# Altium footprint library std-th.PcbLib: 171 footprints (part 11 of 11)
Each footprint in its own frame and in the unit in brackets; x right, y up, seen from the top. Pads: shape width x height; smd on the part's side, far side on the other; paste and mask are expansions set on the pad; w line width, h text height; cw(c..) or ccw(c..) is an arc to the next point about the centre after c.
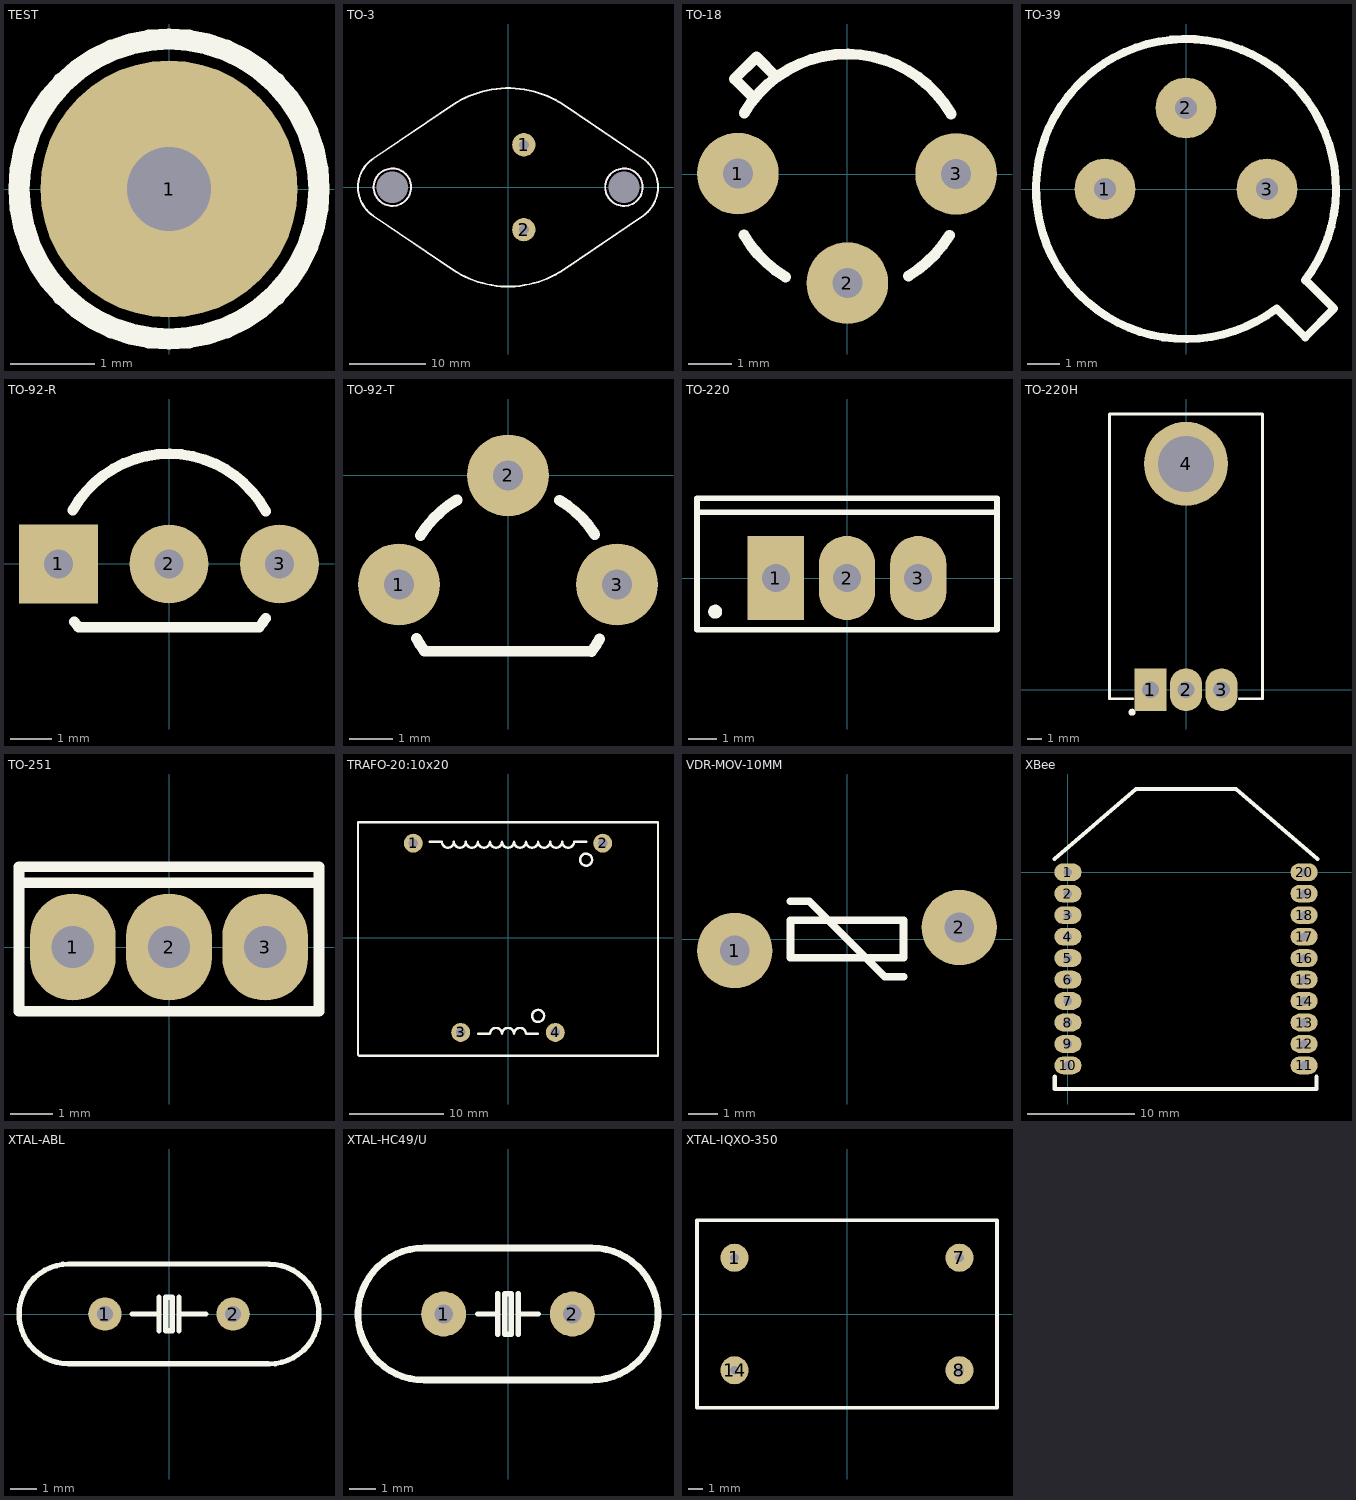
[diagram p10: the footprints below, top view; thin cyan lines are the x and y axes]

## TEST [mil] "Test Point"
pads (1):
  round 120 hole 39.37: 1(0,0)
Top Overlay:
  circle w10: c0,0 r70

## TO-3 [mm] "TO-3 package"
pads (4):
  round 0 hole 4.1: 0(-15.15,0) 1(15.15,0)
  round 3.048 hole 1.3: 1(2.05,5.55) 2(2.05,-5.55)
Top Overlay:
  circle w0.254: c15.15,0 r2.45
  circle w0.254: c-15.15,0 r2.45
  lines w0.254: -17.675,-3.725 cw(c-15.15,0) -17.675,3.725 -7.294,10.761 cw(c0,-0.257) 7.294,10.761 17.675,3.725 cw(c15.049,0) 17.675,-3.725 7.294,-10.761 cw(c0,0) -7.294,-10.761 -17.675,-3.725
Keep-Out Layer:
  circle w0.254: c15.15,0 r2.45
  circle w0.254: c-15.15,0 r2.45
3D body "User Library-2N3055_New.step": height 9.26, standoff -2.64, extent -19.65,-13 19.606,13

## TO-18 [mm] "TO-18 package"
height 15
pads (3):
  round 1.905 hole 0.7: 1(-2.553,0.013) 2(0,-2.54) 3(2.535,0.007)
Top Overlay:
  lines w0.254: -2.412,-1.416 ccw(c0,0) -1.439,-2.399 ; -2.404,1.425 cw(c0,0.013) 2.418,1.4 ; -2.163,1.757 -2.629,2.222 ; -1.65,2.26 -2.121,2.73 ; 1.422,-2.373 ccw(c0,0.013) 2.376,-1.425 ; -2.629,2.222 -2.629,2.222 ; -2.629,2.222 -2.121,2.73 ; -2.121,2.73 -2.121,2.73 ; -2.121,2.73 -2.121,2.73
3D body "User Library-TO-18-2.STEP": height 2.5, standoff -7.41, extent -2.86,-2.834 2.835,2.801

## TO-39 [mm] "TO-39"
height 10
pads (3):
  round 1.905 hole 0.7: 1(-2.54,0) 2(0,2.54) 3(2.54,0)
Top Overlay:
  lines w0.254: 2.842,-3.743 cw(c0,0) 3.73,-2.86 ; 2.866,-3.775 3.737,-4.645 4.635,-3.746 3.739,-2.85
3D body "User Library-TO-39_TO-205AD.step": height 10.6, standoff -7.82, extent -4.7,-4.7 4.687,4.7

## TO-92-R [mm] "TO-92"
height 5
pads (3):
  rect 1.905x1.905 hole 0.7: 1(-2.667,0)
  round 1.905 hole 0.7: 2(0,0) 3(2.667,0)
Top Overlay:
  lines w0.254: -2.324,1.293 cw(c0,0) 2.337,1.27 ; -2.282,-1.394 ccw(c-0.323,0.028) -2.176,-1.53 2.176,-1.53 2.167,-1.522 ; 2.172,-1.526 ccw(c0.323,0.032) 2.338,-1.304
3D body "User Library-TO-92-4.step": height 10.33, standoff -7.7, extent -2.888,-1.53 2.852,2.66

## TO-92-T [mm] "TO-92 package"
pads (3):
  round 1.905 hole 0.7: 1(-2.54,-2.54) 2(0,0) 3(2.54,-2.54)
Top Overlay:
  lines w0.203: 1.945,-4.093 1.947,-4.095
  lines w0.254: -2.127,-3.799 ccw(c-0.017,-2.695) -1.945,-4.093 1.945,-4.093 ; -2.033,-1.396 cw(c0,-2.635) -1.181,-0.568 ; 1.198,-0.577 cw(c0,-2.635) 2.019,-1.373 ; 1.947,-4.095 ccw(c0.034,-2.677) 2.132,-3.805
3D body "User Library-TO-92D.step": height 8, standoff -3.02, extent -2.787,-4.091 2.788,0.248

## TO-220 [mm] "TO, Thru-Hole, Vertical, Heatsink Mounted; 3 In-Line Leads; Pitch 2.54 mm"
height 19.3
pads (3):
  rect 2x3 hole 1: 1(-2.54,0)
  oval 2x3 hole 1: 2(0,0) 3(2.54,0)
Top Overlay:
  circle w0.25: c-4.7,-1.2 r0.125
  lines w0.2: -5.35,2.35 5.35,2.35 ; -5.35,-1.85 5.35,-1.85 5.35,2.85 -5.35,2.85 -5.35,-1.85
Mechanical 13:
  lines w0.1: -5.35,-1.85 -5.35,2.85 5.35,2.85 5.35,-1.85 -5.35,-1.85
Mechanical 15:
  lines w0.1: -0.5,0 0.5,0 ; 0,-0.5 0,0.5
3D body "User Library-TO3B_(TO220)_1.step": height 19, standoff -9.4, extent -5.2,-1.706 5.2,2.794

## TO-220H [mil] "TO-220AB, 3 leads, 100 mil pitch, horizontal"
height 157.48
pads (4):
  rect 90x120 hole 47.24: 1(-100,0)
  oval 90x120 hole 47.24: 2(0,0) 3(100,0)
  round 236.22 hole 157.48 unplated: 4(0,635)
Top Overlay:
  circle w9.84: c-151.57,-62.99 r4.92
  lines w8: -150,-25 -215,-25 -215,775 215,775 215,-25 150,-25
Mechanical 15:
  lines w3.94: -19.69,0 19.68,0 ; 0,-19.68 0,19.69
3D body "TO-220-H.step": height 165.35, standoff -118.11, extent -199.99,-9.84 200.01,757.49

## TO-251 [mm] "TO-251"
height 10
pads (3):
  oval 2.032x2.54 hole 1: 1(-2.28,0) 2(0,0) 3(2.28,0)
Top Overlay:
  lines w0.254: -3.556,-1.524 3.556,-1.524 3.556,1.524 ; -3.556,-1.524 -3.556,1.524 ; -3.556,-1.524 -3.556,1.524 ; -3.556,1.524 3.556,1.524 ; -3.556,1.524 -3.556,1.905 3.556,1.905 3.556,1.524
3D body "User Library-int rectifier to-251aa.step": height 9.65, standoff -3.17, extent -3.25,-0.994 3.25,1.306

## TRAFO-20:10x20 [mm] "Transformer, body 31.7 x 26.7 x 21.8 mm, prim leads 20 mm; sec leads 10 mm; 20 mm spacing"
height 32.8
pads (4):
  round 2 hole 1: 1(-10,10) 2(10,10) 3(-5,-10) 4(5,-10)
Top Overlay:
  circle w0.254: c8.255,8.255 r0.635
  circle w0.254: c3.175,-8.255 r0.635
  lines w0.254: -15.85,-12.344 -15.85,12.192 15.85,12.192 15.85,-12.446 ; -15.748,-12.446 15.748,-12.446 ; -8.255,10.16 -6.985,10.16 ccw(c-6.35,10.16) -5.715,10.16 ccw(c-5.08,10.16) -4.445,10.16 ccw(c-3.81,10.16) -3.175,10.16 ccw(c-2.54,10.16) -1.905,10.16 ccw(c-1.27,10.16) -0.635,10.16 ccw(c0,10.16) 0.635,10.16 ccw(c1.27,10.16) 1.905,10.16 ccw(c2.54,10.16) 3.175,10.16 ccw(c3.81,10.16) 4.445,10.16 ccw(c5.08,10.16) 5.715,10.16 ccw(c6.35,10.16) 6.985,10.16 8.255,10.16 ; -3.175,-10.16 -1.905,-10.16 cw(c-1.27,-10.16) -0.635,-10.16 cw(c0,-10.16) 0.635,-10.16 cw(c1.27,-10.16) 1.905,-10.16 3.175,-10.16
3D body "TR.step": height 23.7, standoff -5, extent -16.244,-13.716 16.256,13.784

## VDR-MOV-10MM [mm] "MOV VDR 10 mm"
height 12
pads (2):
  round 2.54 hole 1: 1(-3.788,-0.39) 2(3.788,0.39)
Top Overlay:
  lines w0.254: -1.905,1.27 -1.27,1.27 1.27,-1.27 1.905,-1.27 ; -1.905,-0.635 -1.905,0.635 1.905,0.635 1.905,-0.635 -1.905,-0.635
3D body "User Library-final MOV7,5.step": height 15.84, standoff -2.66, extent -5.746,-0.86 5.538,0.99

## XBee [mm] "XBee header"
pads (20):
  oval 2.54x1.651 hole 0.8: 1(0,0) 2(0,-2) 3(0,-4) 4(0,-6) 5(0,-8) 6(0,-10) 7(0,-12) 8(0,-14) 9(0,-16) 10(0,-18) 11(22,-18) 12(22,-16) 13(22,-14) 14(22,-12) 15(22,-10) 16(22,-8) 17(22,-6) 18(22,-4) 19(22,-2) 20(22,0)
Top Overlay:
  lines w0.381: -1.25,1.22 6.35,7.75 15.65,7.75 23.25,1.22 ; -1.221,-19.05 -1.221,-20.193 23.159,-20.193 23.159,-19.05
3D body "User Library-XBee-Chip.STEP": height 8.5, standoff 1, extent -1.25,-20.15 23.25,7.75

## XTAL-ABL [mm] "Crystal, Through Hole, 10.3 x 3.8 mm body, 4.88 mm pitch"
height 3.5
pads (2):
  round 1.27 hole 0.6: 1(-2.44,0) 2(2.44,0)
Top Overlay:
  lines w0.203: -1.397,0 -0.381,0 -0.381,-0.635 -0.381,0.635 ; 0.381,-0.635 0.381,0.635 ; 0.381,0 1.397,0 ; 3.765,-1.895 -3.81,-1.895 cw(c-3.81,0.005) -3.81,1.905 3.775,1.905 ; 3.81,-1.9 ccw(c3.81,0) 3.81,1.9 ; -0.127,-0.635 0.127,-0.635 0.127,0.635 -0.127,0.635 -0.127,-0.635
3D body "User Library-HP49US.step": height 3.5, standoff -4, extent -5.675,-2.286 5.675,2.364

## XTAL-HC49/U [mm] "Crystal, HC49/U, 0.192 mil pitch"
height 13.462
pads (2):
  round 1.7 hole 0.7: 1(-2.438,0) 2(2.438,0)
Top Overlay:
  lines w0.203: -1.143,0 -0.381,0 ; -0.381,-0.762 -0.381,0.762 ; 0.381,-0.762 0.381,0.762 ; 0.381,0 1.143,0 ; -0.127,-0.762 0.127,-0.762 0.127,0.762 -0.127,0.762 -0.127,-0.762
  lines w0.254: -3.175,-2.5 cw(c-3.175,0) -3.175,2.5 3.175,2.5 cw(c3.175,0) 3.175,-2.5 -3.175,-2.5
3D body "HC49U.step": height 13.49, standoff -1.97, extent -5.588,-2.336 5.584,2.336

## XTAL-IQXO-350 [mm] "Oscillator"
pads (4):
  round 1.905 hole 0.6: 1(-7.62,3.81) 7(7.62,3.81) 8(7.62,-3.81) 14(-7.62,-3.81)
Top Overlay:
  lines w0.254: -10.16,-6.35 -10.16,6.35 10.16,6.35 10.16,-6.35 -10.16,-6.35
3D body "User Library-ocs-1.step": height 5.41, standoff -5.79, extent -10.125,-6.3 10.125,6.3